# Altium footprint library Minh_Lib.PcbLib: 141 footprints (part 8 of 9)
Each footprint in its own frame and in the unit in brackets; x right, y up, seen from the top. Pads: shape width x height; smd on the part's side, far side on the other; paste and mask are expansions set on the pad; w line width, h text height; cw(c..) or ccw(c..) is an arc to the next point about the centre after c.
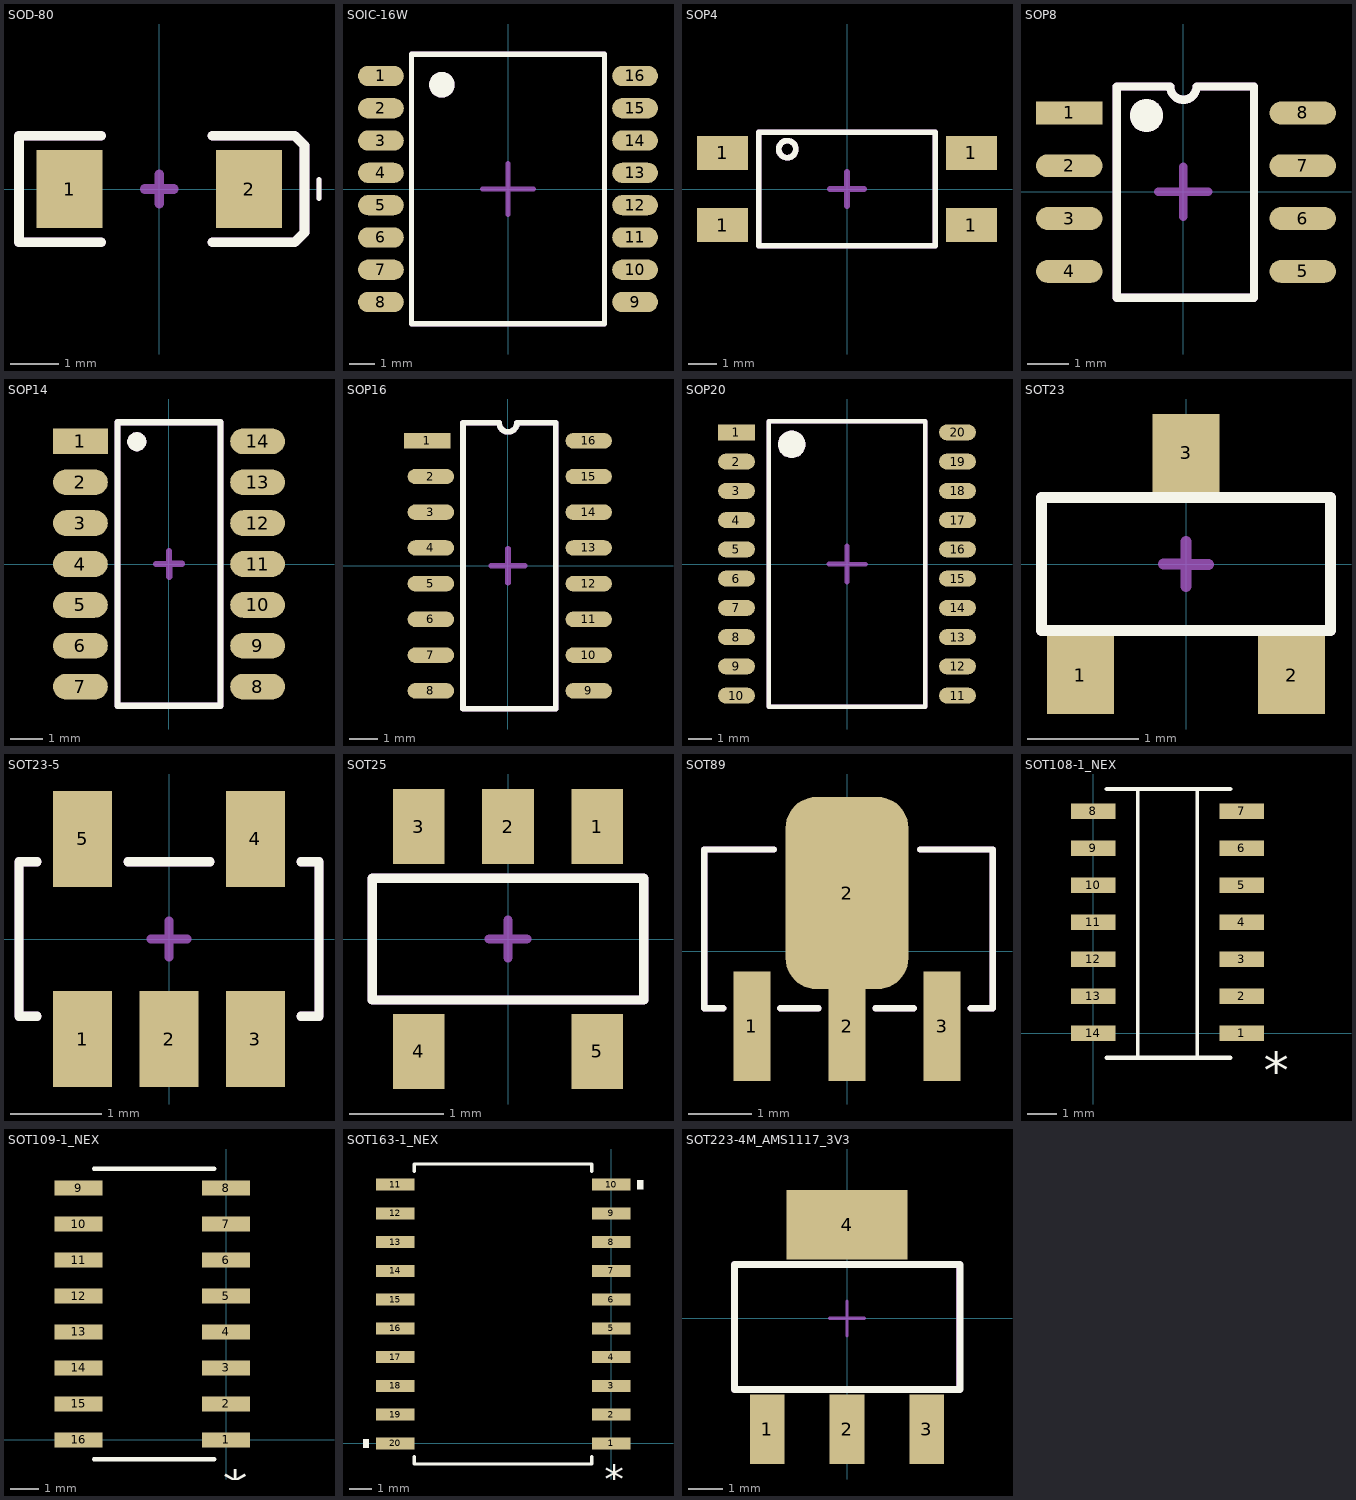
[diagram p7: the footprints below, top view; thin cyan lines are the x and y axes]

## SOD-80 [mm]
pads (2):
  rect 1.37x1.62 smd: 1(-1.855,0) 2(1.855,0)
Top Overlay:
  lines w0.1: 3.3,-0.2 3.3,0.2
  lines w0.2: -1.2,-1.1 -2.9,-1.1 -2.9,1.1 -1.2,1.1 ; 1.1,-1.1 2.8,-1.1 3,-0.9 3,0.9 2.8,1.1 1.1,1.1
Mechanical 13:
  lines w0.1: 3.3,-0.2 3.3,0.2
  lines w0.2: -1.2,-1.1 -2.9,-1.1 -2.9,1.1 -1.2,1.1 ; 1.1,-1.1 2.8,-1.1 3,-0.9 3,0.9 2.8,1.1 1.1,1.1
  text "'.Designator'" at -2.8,-0.8 h0.6
Mechanical 15:
  lines w0.2: -0.3,0 0,0 ; 0,-0.3 0,0 ; 0,0.3 0,0 ; 0.3,0 0,0
3D body "User Library-MiniMelf-2.step": height 1.6, standoff 0, extent -1.82,-0.8 1.88,0.8

## SOIC-16W [mm]
pads (16):
  oval 1.8x0.8 smd: 1(-5,4.445) 2(-5,3.175) 3(-5,1.905) 4(-5,0.635) 5(-5,-0.635) 6(-5,-1.905) 7(-5,-3.175) 8(-5,-4.445) 9(5,-4.445) 10(5,-3.175) 11(5,-1.905) 12(5,-0.635) 13(5,0.635) 14(5,1.905) 15(5,3.175) 16(5,4.445)
Top Overlay:
  circle w0.7: c-2.6,4.1 r0.15
  lines w0.2: -3.8,-5.3 -3.8,5.3 -0.4,5.3 3.8,5.3 3.8,-5.3 -0.4,-5.3 -3.8,-5.3
Mechanical 13:
  text "'.Designator'" at -3.5,-2.7 h0.9
Mechanical 15:
  circle w0.7: c-2.6,4.1 r0.15
  lines w0.2: -1,0 0,0 ; 0,-1 0,0 ; 0,1 0,0 ; 1,0 0,0 ; -3.8,-5.3 -3.8,5.3 -0.4,5.3 3.8,5.3 3.8,-5.3 -0.4,-5.3 -3.8,-5.3
3D body "User Library-SOIC16_Wide_JEDEC_MS-013AA.STEP": height 2.62, standoff -0.03, extent -5.215,-5.255 5.415,5.245

## SOP4 [mm]
pads (4):
  rect 1.8x1.2 smd: 1(-4.375,-1.27) 1(-4.375,1.27) 1(4.375,-1.27) 1(4.375,1.27)
Top Overlay:
  circle w0.2: c-2.1,1.4 r0.3
  lines w0.2: -3.1,-2 -3.1,2 3.1,2 3.1,-2 -3.1,-2
Mechanical 13:
  circle w0.2: c-2.1,1.4 r0.3
  lines w0.2: -3.1,-2 3.1,-2 3.1,2 -3.1,2 -3.1,-2
  text "'.Designator'" at -2.6,-1.6 h0.9
Mechanical 15:
  lines w0.2: -0.6,0 0,0 ; 0,-0.6 0,0 ; 0,0.6 0,0 ; 0.6,0 0,0
3D body "pc817x1nip0f.stp": height 3.85, standoff 0, extent -5,-2.28 5,2.3

## SOP8 [mm] "SOP8"
pads (10):
  rect 1.6x0.55 smd: 1(-2.743,1.895)
  oval 1.6x0.55 smd: 2(-2.743,0.625) 3(-2.743,-0.645) 4(-2.743,-1.915) 5(2.87,-1.915) 6(2.87,-0.645) 7(2.87,0.625) 8(2.87,1.895)
  round 0.8 on Top Overlay: ""(-0.888,1.833)
  round 0.8 on Mech13: ""(-0.888,1.833)
Top Overlay:
  lines w0.2: -1.6,-2.55 1.7,-2.55 1.7,2.53 0.319,2.53 cw(c0.001,2.53) -0.316,2.53 -1.6,2.53 -1.6,-2.55
Mechanical 13:
  lines w0.2: -1.6,-2.55 -1.6,2.53 -0.316,2.53 ccw(c0.001,2.53) 0.319,2.53 1.7,2.53 1.7,-2.55 -1.6,-2.55
  text "'.Designator'" at -1.325,-2.117 h0.4
Mechanical 15:
  lines w0.2: -0.6,0 0,0 ; 0,-0.6 0,0 ; 0,0.6 0,0 ; 0.6,0 0,0
3D body "User Library-SOIC-8-1.step": height 1.75, standoff 0, extent -2.97,-2.448 3.03,2.452

## SOP14 [mm]
pads (16):
  rect 1.7x0.8 smd: 1(-2.75,3.81)
  oval 1.7x0.8 smd: 2(-2.75,2.54) 3(-2.75,1.27) 4(-2.75,0) 5(-2.75,-1.27) 6(-2.75,-2.54) 7(-2.75,-3.81) 8(2.75,-3.81) 9(2.75,-2.54) 10(2.75,-1.27) 11(2.75,0) 12(2.75,1.27) 13(2.75,2.54) 14(2.75,3.81)
  round 0.6 on Top Overlay: ""(-1,3.8)
  round 0.6 on Mech15: ""(-1,3.8)
Top Overlay:
  lines w0.2: -1.6,-4.4 -1.6,4.4 -0.6,4.4 0.6,4.4 1.6,4.4 1.6,-4.4 -1.6,-4.4
Mechanical 13:
  text "'.Designator'" at -1.5,-0.467 h0.7
Mechanical 15:
  lines w0.2: -0.4,0 0,0 0,0.4 ; 0.003,-0.399 0.003,0.001 ; 0.003,0.006 0.403,0.006 ; -1.6,-4.4 1.6,-4.4 1.6,4.4 0.6,4.4 -0.6,4.4 -1.6,4.4 -1.6,-4.4
3D body "User Library-14-SOP.step": height 1.8, standoff 0, extent -2.8,-4.28 3.2,4.28

## SOP16 [mm] "SOP16"
pads (16):
  rect 1.65x0.55 smd: 1(-2.87,4.445)
  oval 1.65x0.55 smd: 2(-2.743,3.175) 3(-2.743,1.905) 4(-2.743,0.635) 5(-2.743,-0.635) 6(-2.743,-1.905) 7(-2.743,-3.175) 8(-2.743,-4.445) 9(2.87,-4.445) 10(2.87,-3.175) 11(2.87,-1.905) 12(2.87,-0.635) 13(2.87,0.635) 14(2.87,1.905) 15(2.87,3.175) 16(2.87,4.445)
Top Overlay:
  lines w0.2: -1.6,-5.08 -1.6,5.08 -0.316,5.08 ccw(c0.001,5.08) 0.319,5.08 1.7,5.08 1.7,-5.08 -1.6,-5.08
Mechanical 13:
  lines w0.2: -1.6,-5.08 -1.6,5.08 -0.316,5.08 ccw(c0.001,5.08) 0.319,5.08 1.7,5.08 1.7,-5.08 -1.6,-5.08
  text "'.Designator'" at -3.2,-1 h1.2
Mechanical 15:
  lines w0.2: -0.6,0 0,0 ; 0,-0.6 0,0 ; 0,0.6 0,0 ; 0.6,0 0,0
3D body "User Library-CH340C.step": height 1.6, standoff 0.01, extent -3.144,-4.991 3.091,4.991

## SOP20 [mm]
pads (22):
  rect 1.6x0.7 smd: 1(-4.8,5.715)
  oval 1.6x0.7 smd: 2(-4.8,4.445) 3(-4.8,3.175) 4(-4.8,1.905) 5(-4.8,0.635) 6(-4.8,-0.635) 7(-4.8,-1.905) 8(-4.8,-3.175) 9(-4.8,-4.445) 10(-4.8,-5.715) 11(4.8,-5.715) 12(4.8,-4.445) 13(4.8,-3.175) 14(4.8,-1.905) 15(4.8,-0.635) 16(4.8,0.635) 17(4.8,1.905) 18(4.8,3.175) 19(4.8,4.445) 20(4.8,5.715)
  round 1.2 on Top Overlay: ""(-2.4,5.2)
  round 1.2 on Mech13: ""(-2.4,5.2)
Top Overlay:
  lines w0.2: -3.4,-6.2 3.4,-6.2 3.4,6.2 -3.4,6.2 -3.4,-6.2
Mechanical 13:
  lines w0.2: -3.4,-6.2 3.4,-6.2 3.4,6.2 -3.4,6.2 -3.4,-6.2
  text "'.Designator'" at -4.8,-0.8 h1.2
Mechanical 15:
  lines w0.2: -0.8,0 0,0 ; 0,-0.8 0,0 ; 0,0.8 0,0 ; 0.002,-0.006 0.802,-0.006
3D body "User Library-SOP20-1.step": height 2.51, standoff 0, extent -5.153,-6.35 5.153,6.35

## SOT23 [mm]
pads (3):
  rect 0.6x0.7 smd: 1(-0.95,-1) 2(0.95,-1) 3(0,1)
Top Overlay:
  lines w0.1: -1.3,-0.6 -1.3,0.6 1.3,0.6 1.3,-0.6 -1.3,-0.6
Mechanical 13:
  lines w0.1: -1.3,-0.6 -1.3,0.6 1.3,0.6 1.3,-0.6 -1.3,-0.6
  text "'.Designator'" at -1.4,-0.4 h0.4
Mechanical 15:
  lines w0.1: -0.2,0 0,0 ; 0,-0.2 0,0 ; 0,0.2 0,0 ; 0.004,-0.006 0.204,-0.006
3D body "CircuitWorks-SOT-23.step": height 1.1, standoff 0, extent -1.5,-1.2 1.5,1.3

## SOT23-5 [mm]
pads (5):
  rect 0.65x1.06 smd: 1(-0.95,-1.1) 2(0,-1.1) 3(0.95,-1.1) 4(0.95,1.1) 5(-0.95,1.1)
Top Overlay:
  lines w0.1: -1.45,-0.85 -1.65,-0.85 -1.65,0.85 -1.45,0.85 ; -0.45,0.85 0.45,0.85 ; 1.45,-0.85 1.65,-0.85 1.65,0.85 1.45,0.85
Mechanical 13:
  lines w0.1: -1.45,-0.85 -1.65,-0.85 -1.65,0.85 -1.45,0.85 ; -0.45,0.85 0.45,0.85 ; 1.45,-0.85 1.65,-0.85 1.65,0.85 1.45,0.85
Mechanical 15:
  lines w0.1: -0.2,0 0,0 ; 0,-0.2 0,0 ; 0,0.2 0,0 ; 0.2,0 0,0
3D body "CircuitWorks-SOT-23-5.step": height 1.1, standoff 0, extent -1.5,-1.25 1.5,1.25

## SOT25 [mm] "XC6204"
pads (5):
  rect 0.55x0.8 smd: 1(0.95,1.2) 2(0,1.2) 3(-0.95,1.2) 4(-0.95,-1.2) 5(0.95,-1.2)
Top Overlay:
  lines w0.1: -1.45,-0.65 -1.45,0.65 1.45,0.65 1.45,-0.65 -1.45,-0.65
Mechanical 13:
  lines w0.1: -1.45,-0.65 -1.45,0.65 1.45,0.65 1.45,-0.65 -1.45,-0.65
  text "'.Designator'" at -1.4,-0.4 h0.4
Mechanical 15:
  lines w0.1: -0.2,0 0,0 ; 0,-0.2 0,0 ; 0,0.2 0,0 ; 0.2,0 0,0
3D body "User Library-SOT-25.step": height 1.2, standoff 0, extent -1.45,-1.4 1.45,1.4

## SOT89 [mm]
pads (4):
  rect 0.58x1.73 smd: 1(-1.5,-1.185) 2(0,-1.185) 3(1.5,-1.185)
  rrect50% 1.933x3.03 smd: 2(0,0.915)
Top Overlay:
  lines w0.1: -1.95,-0.9 -2.25,-0.9 -2.25,1.6 -1.15,1.6 ; -1.05,-0.9 -0.45,-0.9 ; 0.45,-0.9 1.05,-0.9 ; 1.15,1.6 2.3,1.6 2.3,-0.9 1.95,-0.9
Mechanical 13:
  lines w0.1: -1.95,-0.9 -2.25,-0.9 -2.25,1.6 -1.15,1.6 ; -1.05,-0.9 -0.45,-0.9 ; 0.45,-0.9 1.05,-0.9 ; 1.15,1.6 2.3,1.6 2.3,-0.9 1.95,-0.9
  text "'.Designator'" at -2.05,-0.7 h0.4
Mechanical 15:
  lines w0.2: -0.4,0 0,0 ; 0,-0.4 0,0 ; 0,0.4 0,0 ; 0.4,0 0,0
3D body "CircuitWorks-SOT-89.step": height 1.55, standoff 0.05, extent -2.23,-1.9 2.27,2.1

## SOT108-1_NEX [mil]
pads (14):
  rect 60x21 smd: 1(200,0) 2(200,50) 3(200,100) 4(200,150) 5(200,200) 6(200,250) 7(200,300) 8(0,300) 9(0,250) 10(0,200) 11(0,150) 12(0,100) 13(0,50) 14(0,0)
Top Overlay:
  lines w5: 60,-33 60,330 ; 140,-33 140,330
  lines w6: 18,-33 185,-33 ; 18,330 185,330
  text "*" at 230,-75 h50
3D body "SOT108-1_NEX.step": height 69.09, standoff 0, extent -22,-22 222.01,322.01

## SOT109-1_NEX [mil]
pads (16):
  rect 67x21 smd: 1(0,0) 2(0,50) 3(0,100) 4(0,150) 5(0,200) 6(0,250) 7(0,300) 8(0,350) 9(-205,350) 10(-205,300) 11(-205,250) 12(-205,200) 13(-205,150) 14(-205,100) 15(-205,50) 16(-205,0)
Top Overlay:
  lines w6: -183.5,-27 -16.5,-27 ; -183.5,377 -16.5,377
  text "*" at 30,-21 h50
3D body: height 10, standoff 0, extent -112.5,165 -102.5,175
3D body "SOT109-1_NEX.step": height 69.09, standoff 0, extent -224.01,-22.01 20.01,372.01

## SOT163-1_NEX [mil]
pads (20):
  rect 67x21 smd: 1(0,0) 2(0,50) 3(0,100) 4(0,150) 5(0,200) 6(0,250) 7(0,300) 8(0,350) 9(0,400) 10(0,450) 11(-376,450) 12(-376,400) 13(-376,350) 14(-376,300) 15(-376,250) 16(-376,200) 17(-376,150) 18(-376,100) 19(-376,50) 20(-376,0)
Top Overlay:
  region: 45.5,442.5 55.5,442.5 55.5,457.5 45.5,457.5
  region: -421.5,-7.5 -431.5,-7.5 -431.5,7.5 -421.5,7.5
  lines w6: -342.5,-23.6 -342.5,-36 -33.5,-36 -33.5,-23.6 ; -342.5,473.6 -342.5,486 -33.5,486 -33.5,473.6
  text "*" at 22.5,-16 h50
3D body: height 10, standoff 0, extent -198,215 -188,225
3D body "SOT163-1_NEX.step": height 104.09, standoff 0, extent -397.48,-30.98 21.49,480.98

## SOT223-4M_AMS1117_3V3 [mm] "SOT223, 4-Leads, Body 6.5x3.5mm, Pitch 2.3mm, Lead Span 7mm, IPC Low Density"
height 1.8
pads (4):
  rect 1x2 smd: 1(-2.3,-3.2) 2(0,-3.2) 3(2.3,-3.2)
  rect 3.5x2 smd: 4(0,2.7)
Top Overlay:
  lines w0.2: -3.25,-2.05 3.26,-2.05 3.26,1.55 -3.25,1.55 -3.25,-2.05
Mechanical 13:
  lines w0.2: -3.25,-2.05 3.25,-2.05 3.25,1.55 -3.25,1.55 -3.25,-2.05
  text "'.Designator'" at -3.2,-0.333 h0.8
Mechanical 15:
  lines w0.1: -0.5,0 0.5,0 ; 0,-0.5 0,0.5
3D body "AMS1117_3V3_axisY.step": height 1.9, standoff -0.01, extent -3.355,-3.909 3.355,3.391

## SS12D06 [mm]